# Altium footprint library SMT.PcbLib: 151 footprints (part 2 of 10)
Each footprint in its own frame and in the unit in brackets; x right, y up, seen from the top. Pads: shape width x height; smd on the part's side, far side on the other; paste and mask are expansions set on the pad; w line width, h text height; cw(c..) or ccw(c..) is an arc to the next point about the centre after c.
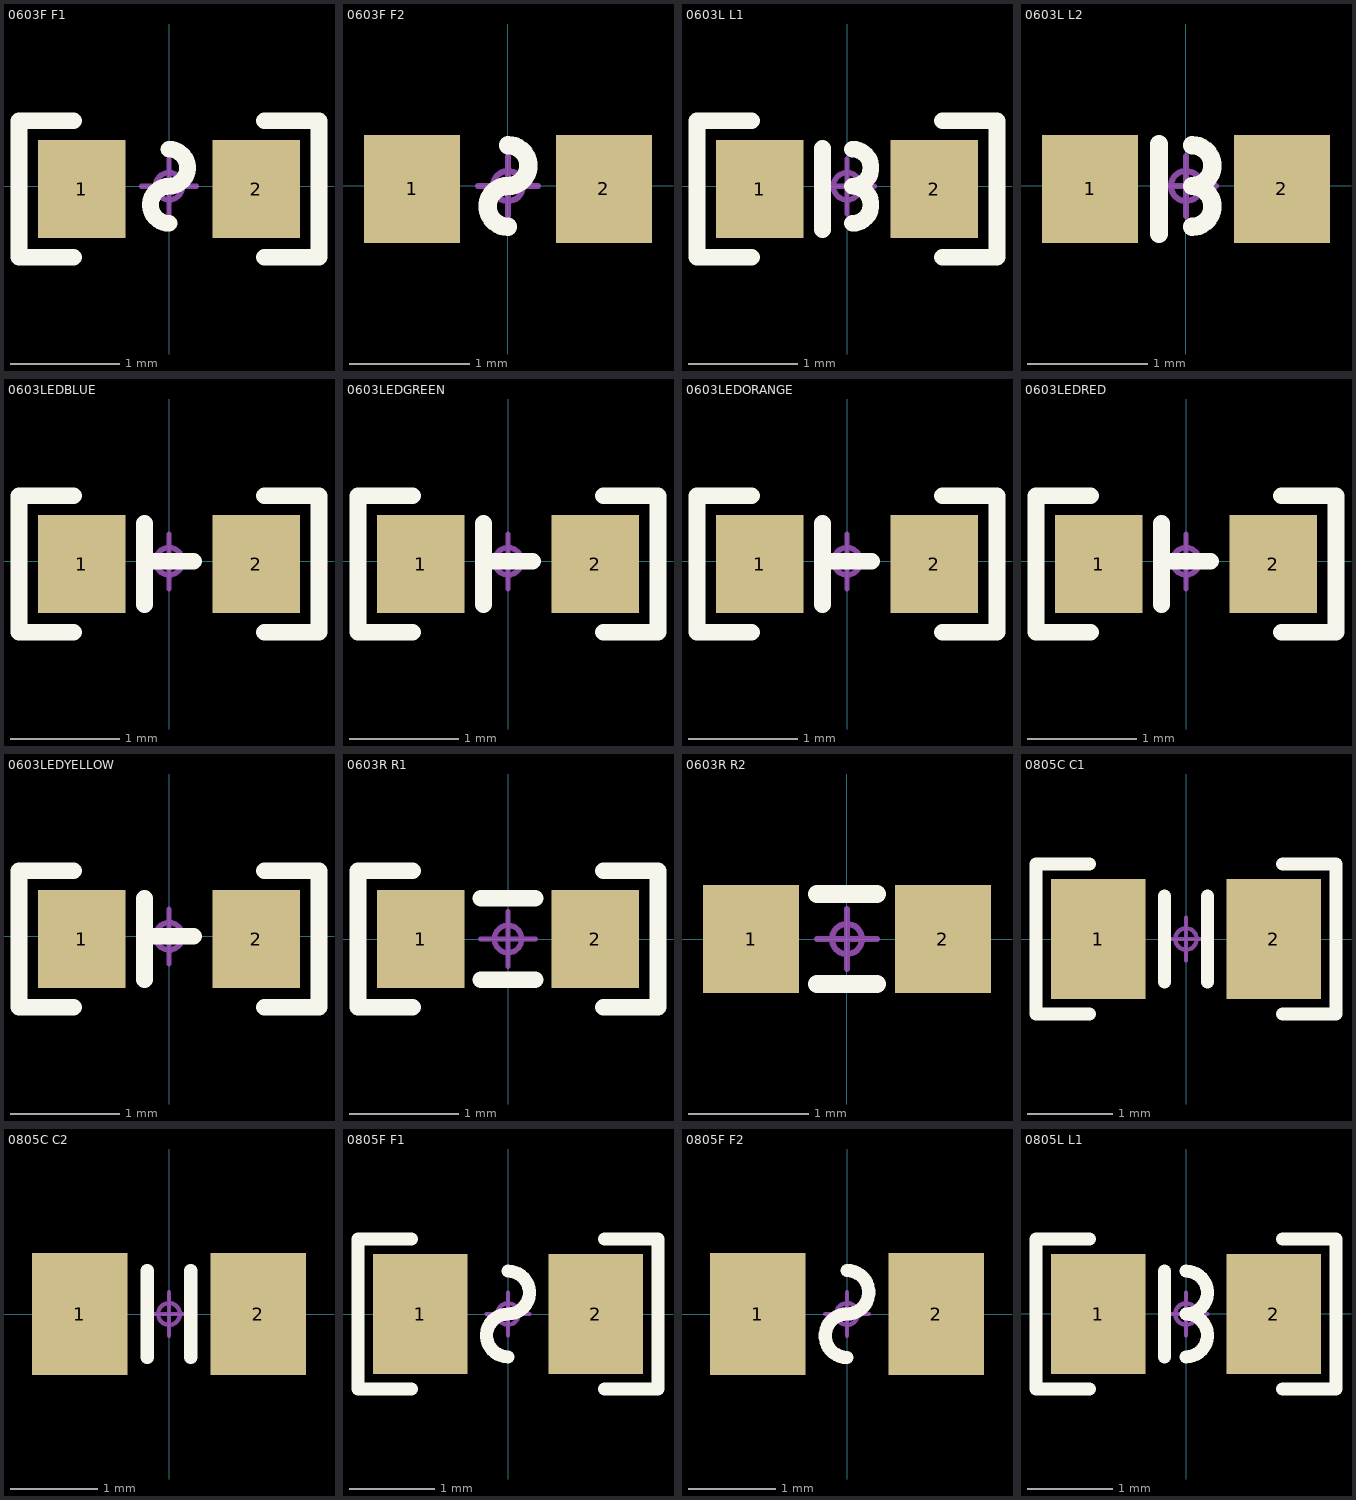
[diagram p1: the footprints below, top view; thin cyan lines are the x and y axes]

## 0603F F1 [mm]
pads (2):
  rect 0.8x0.9 smd paste-0.02: 1(-0.8,-0.025) 2(0.8,-0.025)
Top Overlay:
  lines w0.152: -0.875,-0.65 -1.375,-0.65 -1.375,0.6 -0.875,0.6 ; 0,-0.34 cw(c0,-0.17) 0,0 ccw(c0,0.17) 0,0.34 ; 0.875,-0.65 1.375,-0.65 1.375,0.6 0.875,0.6
Mechanical 15:
  circle w0.05: c0,0 r0.125
  lines w0.05: -0.25,0 0.25,0 ; 0,-0.25 0,0.25
3D body: height 0.51, standoff 0, extent -0.559,-0.381 0.559,0.381

## 0603F F2 [mm]
pads (2):
  rect 0.8x0.9 smd paste-0.02: 1(-0.8,-0.025) 2(0.8,-0.025)
Top Overlay:
  lines w0.152: 0,-0.34 cw(c0,-0.17) 0,0 ccw(c0,0.17) 0,0.34
Mechanical 15:
  circle w0.05: c0,0 r0.125
  lines w0.05: -0.25,0 0.25,0 ; 0,-0.25 0,0.25
3D body: height 0.51, standoff 0, extent -0.559,-0.381 0.559,0.381

## 0603L L1 [mm]
pads (2):
  rect 0.8x0.9 smd paste-0.02: 1(-0.8,-0.025) 2(0.8,-0.025)
Top Overlay:
  lines w0.152: -0.875,-0.65 -1.375,-0.65 -1.375,0.6 -0.875,0.6 ; -0.225,-0.4 -0.225,0.35 ; 0.05,-0.34 ccw(c0.05,-0.17) 0.05,0 ccw(c0.05,0.17) 0.05,0.34 ; 0.875,-0.65 1.375,-0.65 1.375,0.6 0.875,0.6
Mechanical 15:
  circle w0.05: c0,0 r0.125
  lines w0.05: -0.25,0 0.25,0 ; 0,-0.25 0,0.25
3D body: height 0.51, standoff 0, extent -0.559,-0.381 0.559,0.381

## 0603L L2 [mm]
pads (2):
  rect 0.8x0.9 smd paste-0.02: 1(-0.8,-0.025) 2(0.8,-0.025)
Top Overlay:
  lines w0.152: -0.225,-0.4 -0.225,0.35 ; 0.05,-0.34 ccw(c0.05,-0.17) 0.05,0 ccw(c0.05,0.17) 0.05,0.34
Mechanical 15:
  circle w0.05: c0,0 r0.125
  lines w0.05: -0.25,0 0.25,0 ; 0,-0.25 0,0.25
3D body: height 0.51, standoff 0, extent -0.559,-0.381 0.559,0.381

## 0603LEDBLUE [mm]
pads (2):
  rect 0.8x0.9 smd paste-0.02: 1(-0.8,-0.025) 2(0.8,-0.025)
Top Overlay:
  lines w0.152: -0.875,-0.65 -1.375,-0.65 -1.375,0.6 -0.875,0.6 ; -0.225,-0.4 -0.225,0.35 ; -0.225,0 0.225,0 ; 0.875,-0.65 1.375,-0.65 1.375,0.6 0.875,0.6
Mechanical 15:
  circle w0.05: c0,0 r0.125
  lines w0.05: -0.25,0 0.25,0 ; 0,-0.25 0,0.25
3D body "User Library-led_0603LED0603 blue.STEP": height 0.6, standoff 0, extent -0.81,-0.4 0.81,0.4

## 0603LEDGREEN [mm]
pads (2):
  rect 0.8x0.9 smd paste-0.02: 1(-0.8,-0.025) 2(0.8,-0.025)
Top Overlay:
  lines w0.152: -0.875,-0.65 -1.375,-0.65 -1.375,0.6 -0.875,0.6 ; -0.225,-0.4 -0.225,0.35 ; -0.225,0 0.225,0 ; 0.875,-0.65 1.375,-0.65 1.375,0.6 0.875,0.6
Mechanical 15:
  circle w0.05: c0,0 r0.125
  lines w0.05: -0.25,0 0.25,0 ; 0,-0.25 0,0.25
3D body "User Library-led_0603LED0603 green.STEP": height 0.6, standoff 0, extent -0.81,-0.4 0.81,0.4

## 0603LEDORANGE [mm]
pads (2):
  rect 0.8x0.9 smd paste-0.02: 1(-0.8,-0.025) 2(0.8,-0.025)
Top Overlay:
  lines w0.152: -0.875,-0.65 -1.375,-0.65 -1.375,0.6 -0.875,0.6 ; -0.225,-0.4 -0.225,0.35 ; -0.225,0 0.225,0 ; 0.875,-0.65 1.375,-0.65 1.375,0.6 0.875,0.6
Mechanical 15:
  circle w0.05: c0,0 r0.125
  lines w0.05: -0.25,0 0.25,0 ; 0,-0.25 0,0.25
3D body "User Library-led_0603LED0603 orange_.STEP": height 0.6, standoff 0, extent -0.81,-0.4 0.81,0.4

## 0603LEDRED [mm]
pads (2):
  rect 0.8x0.9 smd paste-0.02: 1(-0.8,-0.025) 2(0.8,-0.025)
Top Overlay:
  lines w0.152: -0.875,-0.65 -1.375,-0.65 -1.375,0.6 -0.875,0.6 ; -0.225,-0.4 -0.225,0.35 ; -0.225,0 0.225,0 ; 0.875,-0.65 1.375,-0.65 1.375,0.6 0.875,0.6
Mechanical 15:
  circle w0.05: c0,0 r0.125
  lines w0.05: -0.25,0 0.25,0 ; 0,-0.25 0,0.25
3D body "User Library-led_0603LED0603 red.STEP": height 0.6, standoff 0, extent -0.81,-0.4 0.81,0.4

## 0603LEDYELLOW [mm]
pads (2):
  rect 0.8x0.9 smd paste-0.02: 1(-0.8,-0.025) 2(0.8,-0.025)
Top Overlay:
  lines w0.152: -0.875,-0.65 -1.375,-0.65 -1.375,0.6 -0.875,0.6 ; -0.225,-0.4 -0.225,0.35 ; -0.225,0 0.225,0 ; 0.875,-0.65 1.375,-0.65 1.375,0.6 0.875,0.6
Mechanical 15:
  circle w0.05: c0,0 r0.125
  lines w0.05: -0.25,0 0.25,0 ; 0,-0.25 0,0.25
3D body "User Library-led_0603LED0603 yellow_.STEP": height 0.6, standoff 0, extent -0.81,-0.4 0.81,0.4

## 0603R R1 [mm]
pads (2):
  rect 0.8x0.9 smd paste-0.02: 1(-0.8,0) 2(0.8,0)
Top Overlay:
  lines w0.152: -0.875,-0.625 -1.375,-0.625 -1.375,0.625 -0.875,0.625 ; -0.25,-0.375 0.25,-0.375 ; -0.25,0.375 0.25,0.375 ; 0.875,-0.625 1.375,-0.625 1.375,0.625 0.875,0.625
Mechanical 15:
  circle w0.05: c0,0 r0.125
  lines w0.05: -0.25,0 0.25,0 ; 0,-0.25 0,0.25
3D body "RESC1608X05L.step": height 0.45, standoff 0, extent -0.8,-0.4 0.8,0.4

## 0603R R2 [mm]
pads (2):
  rect 0.8x0.9 smd paste-0.02: 1(-0.8,0) 2(0.8,0)
Top Overlay:
  lines w0.152: -0.25,-0.375 0.25,-0.375 ; -0.25,0.375 0.25,0.375
Mechanical 15:
  circle w0.05: c0,0 r0.125
  lines w0.05: -0.25,0 0.25,0 ; 0,-0.25 0,0.25
3D body "RESC1608X05L.step": height 0.45, standoff 0, extent -0.8,-0.4 0.8,0.4

## 0805C C1 [mm]
pads (2):
  rect 1.1x1.4 smd paste-0.02: 1(-1.025,0) 2(1.025,0)
Top Overlay:
  lines w0.152: -1.125,-0.875 -1.75,-0.875 -1.75,0.875 -1.125,0.875 ; -0.25,-0.5 -0.25,0.5 ; 0.25,-0.5 0.25,0.5 ; 1.125,-0.875 1.75,-0.875 1.75,0.875 1.125,0.875
Mechanical 15:
  circle w0.05: c0,0 r0.125
  lines w0.05: -0.25,0 0.25,0 ; 0,-0.25 0,0.25
3D body "0805-c.stp": height 1, standoff 0, extent -1,-0.5 1,0.5

## 0805C C2 [mm]
pads (2):
  rect 1.1x1.4 smd paste-0.02: 1(-1.025,0) 2(1.025,0)
Top Overlay:
  lines w0.152: -0.25,-0.5 -0.25,0.5 ; 0.25,-0.5 0.25,0.5
Mechanical 15:
  circle w0.05: c0,0 r0.125
  lines w0.05: -0.25,0 0.25,0 ; 0,-0.25 0,0.25
3D body "0805-c.stp": height 1, standoff 0, extent -1,-0.5 1,0.5

## 0805F F1 [mm]
pads (2):
  rect 1.1x1.4 smd paste-0.02: 1(-1.025,0) 2(1.025,0)
Top Overlay:
  lines w0.152: -1.125,-0.875 -1.75,-0.875 -1.75,0.875 -1.125,0.875 ; 0,-0.5 cw(c0,-0.25) 0,0 ccw(c0,0.25) 0,0.5 ; 1.125,-0.875 1.75,-0.875 1.75,0.875 1.125,0.875
Mechanical 15:
  circle w0.05: c0,0 r0.125
  lines w0.05: -0.25,0 0.25,0 ; 0,-0.25 0,0.25
3D body "R0805.STEP": height 0.55, standoff 0, extent -1,-0.63 1,0.63

## 0805F F2 [mm]
pads (2):
  rect 1.1x1.4 smd paste-0.02: 1(-1.025,0) 2(1.025,0)
Top Overlay:
  lines w0.152: 0,-0.5 cw(c0,-0.25) 0,0 ccw(c0,0.25) 0,0.5
Mechanical 15:
  circle w0.05: c0,0 r0.125
  lines w0.05: -0.25,0 0.25,0 ; 0,-0.25 0,0.25
3D body "R0805.STEP": height 0.55, standoff 0, extent -1,-0.63 1,0.63

## 0805L L1 [mm]
pads (2):
  rect 1.1x1.4 smd paste-0.02: 1(-1.025,0) 2(1.025,0)
Top Overlay:
  lines w0.152: -1.125,-0.875 -1.75,-0.875 -1.75,0.875 -1.125,0.875 ; -0.25,-0.5 -0.25,0.5 ; 0,-0.5 ccw(c0,-0.25) 0,0 ccw(c0,0.25) 0,0.5 ; 1.125,-0.875 1.75,-0.875 1.75,0.875 1.125,0.875
Mechanical 15:
  circle w0.05: c0,0 r0.125
  lines w0.05: -0.25,0 0.25,0 ; 0,-0.25 0,0.25
3D body "R0805.STEP": height 0.55, standoff 0, extent -1,-0.63 1,0.63